# Altium footprint library KwantLib.PcbLib: 249 footprints (part 5 of 16)
Each footprint in its own frame and in the unit in brackets; x right, y up, seen from the top. Pads: shape width x height; smd on the part's side, far side on the other; paste and mask are expansions set on the pad; w line width, h text height; cw(c..) or ccw(c..) is an arc to the next point about the centre after c.
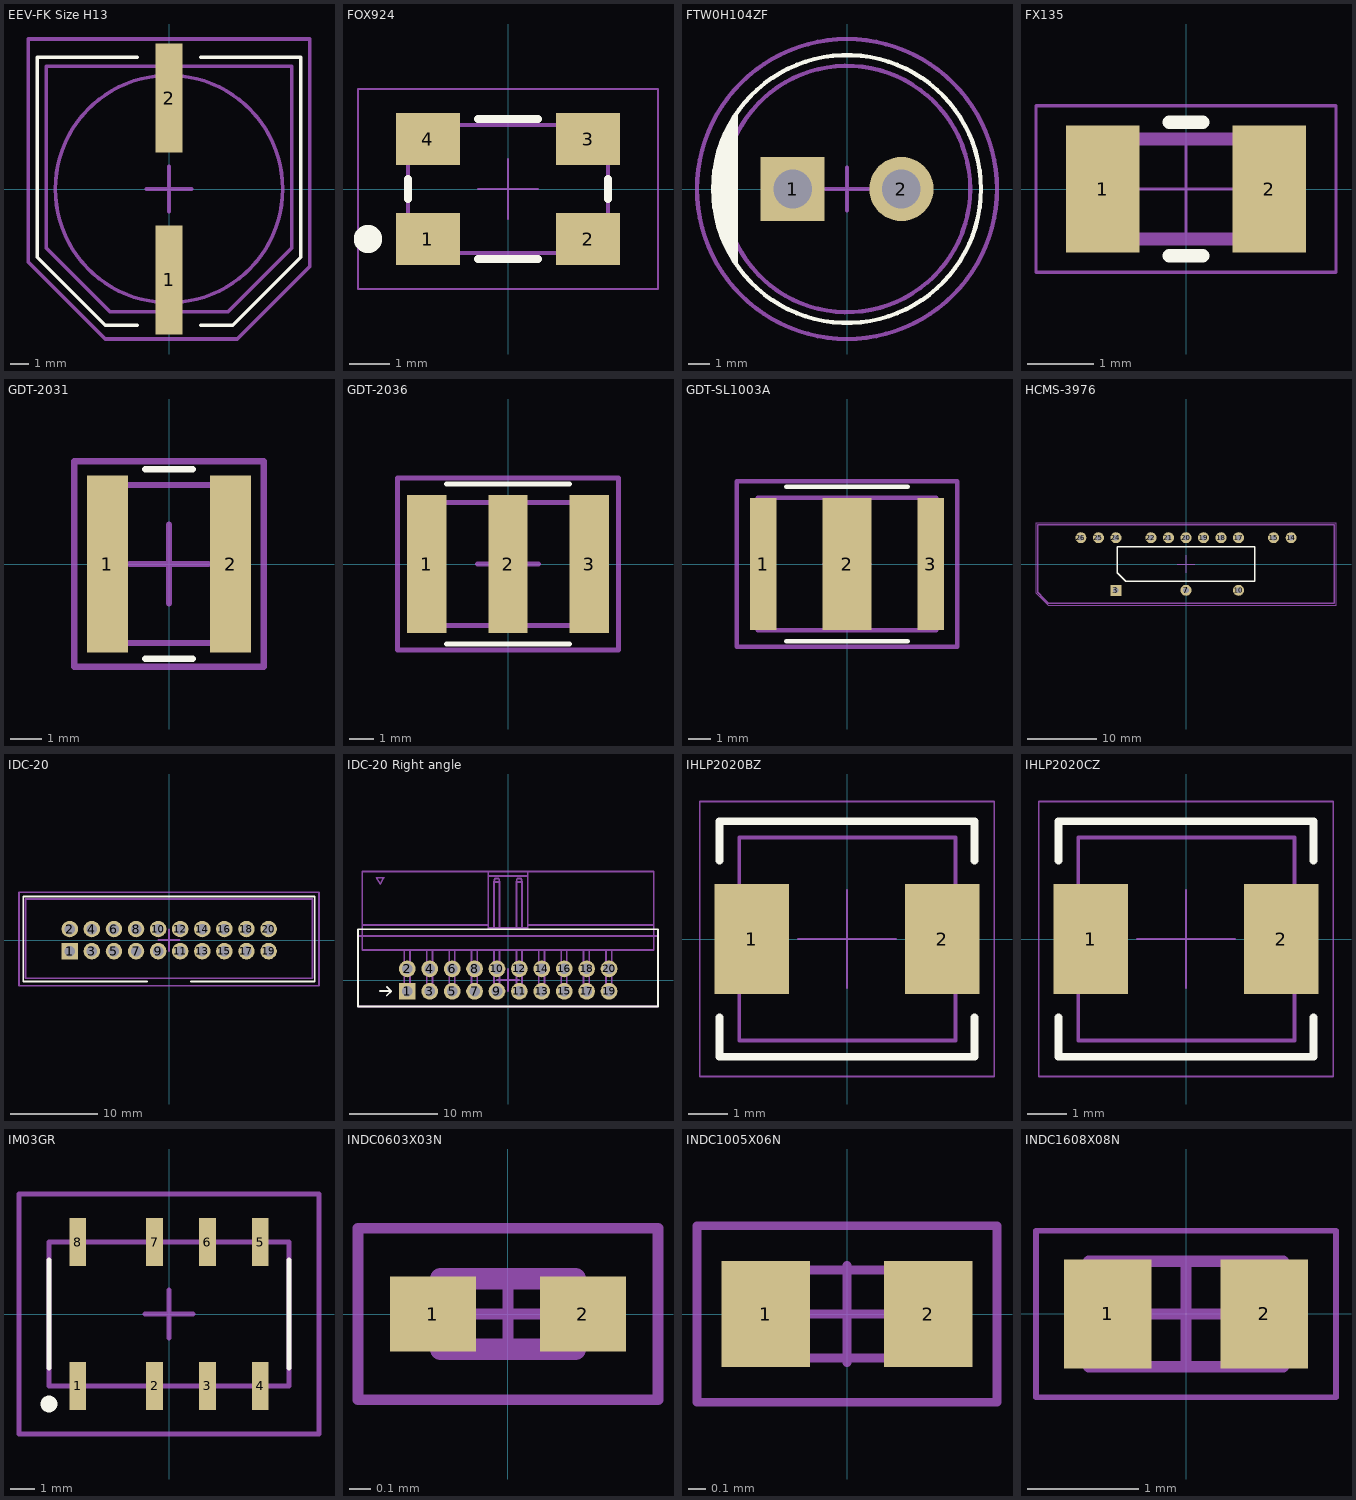
[diagram p4: the footprints below, top view; thin cyan lines are the x and y axes]

## EEV-FK Size H13 [mm] "EEV Aluminum Electrolytic Capacitor"
height 13
pads (2):
  rect 1.5x6 smd mask+0.07: 1(0,-5) 2(0,5)
Top Overlay:
  lines w0.2: -1.75,-7.5 -3.5,-7.5 -7.25,-3.75 -7.25,7.25 -1.75,7.25 ; 1.75,-7.5 3.5,-7.5 7.25,-3.75 7.25,7.25 1.75,7.25
Mechanical 13:
  circle w0.2: c0,0 r6.25
  lines w0.2: -6.75,-3.25 -6.75,6.75 -0.45,6.75 -0.45,7.45 0.45,7.45 0.45,6.75 6.75,6.75 6.75,-3.25 3.25,-6.75 0.45,-6.75 0.45,-7.45 -0.45,-7.45 -0.45,-6.75 -3.25,-6.75 -6.75,-3.25
Mechanical 15:
  lines w0.2: -1.25,0 1.25,0 ; 0,-1.25 0,1.25 ; -7.75,-4 -7.75,8.25 7.75,8.25 7.75,-4.25 3.75,-8.25 -3.5,-8.25 -7.75,-4
3D body: height 8.6, standoff -3.5, extent 0,0 0,0
3D body "EEV-SIZE_H13.stp": height 13.5, standoff 0, extent -6.75,-7.45 6.75,7.45

## FOX924 [mm] "Ultra Miniature SMD TCXO, 5x7mm"
height 1.5
pads (4):
  rect 1.6x1.3 smd paste-0.05: 1(-2,-1.25) 2(2,-1.25) 3(2,1.25) 4(-2,1.25)
Top Overlay:
  circle w0.508: c-3.5,-1.25 r0.1
  lines w0.2: -2.5,-0.25 -2.5,0.25 ; -0.75,-1.75 0.75,-1.75 ; -0.75,1.75 0.75,1.75 ; 2.5,-0.25 2.5,0.25
Mechanical 13:
  lines w0.1: -2.5,-1.6 -2.5,1.6 2.5,1.6 2.5,-1.6 -2.5,-1.6
Mechanical 15:
  lines w0.05: -0.75,0 0.75,0 ; 0,-0.75 0,0.75 ; -3.75,-2.5 3.75,-2.5 3.75,2.5 -3.75,2.5 -3.75,-2.5
3D body "FOX-924.stp": height 1.5, standoff 0, extent -2.5,-1.6 2.5,1.6

## FTW0H104ZF [mm] "Supercapacitor"
height 8.5
pads (2):
  rect 3x3 hole 1.8 mask+0.07: 1(-2.54,0)
  round 3 hole 1.8 mask+0.07: 2(2.54,0)
Top Overlay:
  circle w0.2: c0,0 r6.25
  lines w0.2: -6.15,-0.925 -6.15,0.75 ; -6.05,-1.425 -6.05,1.425 ; -5.925,-1.725 -5.925,1.85 ; -5.825,-2.1 -5.825,2.175 ; -5.7,-2.45 -5.7,2.575 ; -5.55,-2.8 -5.55,2.875 ; -5.4,-3.125 -5.4,3.125 ; -5.275,-3.35 -5.275,3.25 ; -5.175,-3.5 -5.175,3.5
Mechanical 13:
  circle w0.2: c0,0 r5.75
Mechanical 15:
  circle w0.2: c0,0 r7
  lines w0.2: -1,0 1,0 ; 0,-1 0,1
3D body "FTW0H104ZF.stp": height 8.5, standoff -2.7, extent -5.655,-5.748 5.75,5.748

## FX135 [mm] "SMD 3.2x1.5mm Cristal"
height 0.9
pads (2):
  rect 1.1x1.9 smd paste-0.05: 1(-1.25,0) 2(1.25,0)
Top Overlay:
  lines w0.2: -0.25,-1 0.25,-1 ; -0.25,1 0.25,1
Mechanical 13:
  lines w0.2: -1.6,-0.75 -1.6,0.75 1.6,0.75 1.6,-0.75 -1.6,-0.75
Mechanical 15:
  lines w0.05: -0.75,0 0.75,0 ; 0,-0.75 0,0.75 ; -2.25,-1.25 -2.25,1.25 2.25,1.25 2.25,-1.25 -2.25,-1.25
3D body "FX135A.stp": height 0.9, standoff 0, extent -1.6,-0.75 1.6,0.75

## GDT-2031 [mm] "Bourns GDT 2031"
height 5
pads (2):
  rect 1.3x5.6 smd paste-0.06 mask+0.07: 1(-1.95,0) 2(1.95,0)
Top Overlay:
  lines w0.2: -0.75,-3 0.75,-3 ; -0.75,3 0.75,3
Mechanical 13:
  lines w0.2: -2.2,-2.499 2.2,-2.499 2.2,2.499 -2.2,2.499 -2.2,-2.499
Mechanical 15:
  lines w0.2: -1.25,0 1.25,0 ; 0,-1.25 0,1.25 ; -3,-3.25 -3,3.25 3,3.25 3,-3.25 -3,-3.25
3D body "GDT 2031-xxT-SM.stp": height 5, standoff 0, extent -2.2,-2.5 2.2,2.5

## GDT-2036 [mm] "Bourns GDT 2036"
height 5
pads (3):
  rect 1.6x5.6 smd: 1(-3.3,0) 2(0,0) 3(3.3,0)
Top Overlay:
  lines w0.2: -2.5,-3.25 2.5,-3.25 ; -2.5,3.25 2.5,3.25
Mechanical 13:
  lines w0.2: -3.65,-2.499 -3.65,2.501 3.65,2.501 3.65,-2.499 -3.65,-2.499
Mechanical 15:
  lines w0.2: -1.25,0 1.25,0 ; 0,-1.25 0,1.25 ; -4.5,-3.5 -4.5,3.5 4.5,3.5 4.5,-3.5 -4.5,-3.5
3D body: height 5, standoff 0, extent -3.65,-2.499 3.65,2.501

## GDT-SL1003A [mm] "Разрядник LittleFuse"
height 6
pads (3):
  rect 1.2x6 smd: 1(-3.8,0) 3(3.8,0)
  rect 2.2x6 smd: 2(0,0)
Top Overlay:
  lines w0.2: -2.75,-3.5 2.75,-3.5 ; -2.75,3.5 2.75,3.5
Mechanical 13:
  lines w0.2: -4.05,-3 4.05,-3 4.05,3 -4.05,3 -4.05,-3
Mechanical 15:
  lines w0.2: -1,0 1,0 ; 0,-1 0,1 ; -5,-3.75 -5,3.75 5,3.75 5,-3.75 -5,-3.75
3D body "GDT SL1003AxxSM.stp": height 6, standoff 0, extent -4.05,-3 4.05,3

## HCMS-3976 [mm]
height 5.309
pads (14):
  rect 1.6x1.6 hole 0.8: 3(-10.16,-3.81)
  round 1.6 hole 0.8: 7(0,-3.81) 10(7.62,-3.81) 14(15.24,3.81) 15(12.7,3.81) 17(7.62,3.81) 18(5.08,3.81) 19(2.54,3.81) 20(0,3.81) 21(-2.54,3.81) 22(-5.08,3.81) 24(-10.16,3.81) 25(-12.7,3.81) 26(-15.24,3.81)
Top Overlay:
  lines w0.2: -10,-1.25 -8.75,-2.5 10,-2.5 10,2.5 -10,2.5 -10,-1.25
Mechanical 13:
  lines w0.2: -21.46,-4.195 -21.46,4.2 -21.46,4.95 -21.46,5.71 21.46,5.71 21.46,4.95 21.46,4.2 21.46,-4.2 21.46,-4.95 21.46,-5.71 -19.945,-5.71 -20.705,-4.95 -21.455,-4.2 -21.46,-4.195
Mechanical 15:
  lines w0.05: -1.27,0 1.27,0 ; 0,-1.27 0,1.27 ; -21.75,-4.25 -20,-6 21.75,-6 21.75,6 -21.75,6 -21.75,-4.25
3D body "HCMS-3976.stp": height 5.3, standoff -1.5, extent -21.46,-5.71 21.46,5.71

## IDC-20 [mm] "2.54 мм разъем"
height 9.1
pads (20):
  rect 1.9x1.9 hole 1.2: 1(-11.41,-1.27)
  round 1.9 hole 1.2: 2(-11.41,1.27) 3(-8.87,-1.27) 4(-8.87,1.27) 5(-6.33,-1.27) 6(-6.33,1.27) 7(-3.79,-1.27) 8(-3.79,1.27) 9(-1.25,-1.27) 10(-1.25,1.27) 11(1.29,-1.27) 12(1.29,1.27) 13(3.83,-1.27) 14(3.83,1.27) 15(6.37,-1.27) 16(6.37,1.27) 17(8.91,-1.27) 18(8.91,1.27) 19(11.45,-1.27) 20(11.45,1.27)
Top Overlay:
  lines w0.2: -2.5,-4.75 -16.75,-4.75 -16.75,5 16.75,5 16.75,-4.75 2.5,-4.75
Mechanical 13:
  lines w0.2: -16.51,-4.375 -16.51,4.725 16.51,4.725 16.51,-4.375 -16.51,-4.375
Mechanical 15:
  lines w0.2: -1.25,0 1.25,0 ; 0,-1.25 0,1.25 ; -17.25,-5.25 17.25,-5.25 17.25,5.5 -17.25,5.5 -17.25,-5.25
3D body "IDC-20.stp": height 9.1, standoff -2.75, extent -16.51,-4.375 16.51,4.725

## IDC-20 Right angle [mm] "2.54 мм разъем правый"
height 9.1
pads (20):
  rect 1.9x1.9 hole 1.2: 1(-11.41,-1.27)
  round 1.9 hole 1.2: 2(-11.41,1.27) 3(-8.87,-1.27) 4(-8.87,1.27) 5(-6.33,-1.27) 6(-6.33,1.27) 7(-3.79,-1.27) 8(-3.79,1.27) 9(-1.25,-1.27) 10(-1.25,1.27) 11(1.29,-1.27) 12(1.29,1.27) 13(3.83,-1.27) 14(3.83,1.27) 15(6.37,-1.27) 16(6.37,1.27) 17(8.91,-1.27) 18(8.91,1.27) 19(11.45,-1.27) 20(11.45,1.27)
Top Overlay:
  lines w0.2: -14.5,-1.25 -13.25,-1.25 ; -13.75,-1.75 -13.25,-1.25 ; -13.75,-0.75 -13.25,-1.25 ; -17,-3 -17,5.75 17,5.75 17,-3 -17,-3
Mechanical 13:
  lines w0.2: -16.51,6.25 -2.25,6.25 ; -11.75,3.41 -11.75,-0.65 -11.75,-1.59 -11.11,-1.59 -11.11,-0.65 -11.11,3.41 ; -9.21,3.41 -9.21,-0.65 -9.21,-1.59 -8.57,-1.59 -8.57,-0.65 -8.57,3.41 ; -6.67,3.41 -6.67,-0.65 -6.67,-1.59 -6.03,-1.59 -6.03,-0.65 -6.03,3.41 ; -4.13,3.41 -4.13,-0.65 -4.13,-1.59 -3.49,-1.59 -3.49,-0.65 -3.49,3.41 ; -2.25,11.81 2.25,11.81 ; -1.59,3.41 -1.59,-0.65 -1.59,-1.59 -0.95,-1.59 -0.95,-0.65 -0.95,3.41 ; -1.59,5.91 -1.59,11.11 ; -0.95,5.91 -0.95,11.11 ; 0.95,3.41 0.95,-0.65 0.95,-1.59 1.59,-1.59 1.59,-0.65 1.59,3.41 ; 0.95,5.91 0.95,11.11 ; 1.59,5.91 1.59,11.11 ; 2.25,6.25 16.51,6.25 ; 3.49,3.41 3.49,-0.65 3.49,-1.59 4.13,-1.59 4.13,-0.65 4.13,3.41 ; 6.03,3.41 6.03,-0.65 6.03,-1.59 6.67,-1.59 6.67,-0.65 6.67,3.41 ; 8.57,3.41 8.57,-0.65 8.57,-1.59 9.21,-1.59 9.21,-0.65 9.21,3.41 ; 11.11,3.41 11.11,-0.65 11.11,-1.59 11.75,-1.59 11.75,-0.65 11.75,3.41 ; -2.25,12.31 -2.25,5.91 2.25,5.91 2.25,12.31 ; -2.25,12.31 2.25,12.31 ; -2.25,12.31 -16.51,12.31 -16.51,3.41 16.51,3.41 16.51,12.31 2.25,12.31 ; -1.59,11.11 -0.95,11.11 ; -1.59,11.11 -1.49,11.51 -1.05,11.51 -0.95,11.11 ; 0.95,11.11 1.59,11.11 ; 0.95,11.11 1.05,11.51 1.49,11.51 1.59,11.11 ; -14.91,11.61 -14.485,10.874 -14.06,11.61 -14.91,11.61
Mechanical 15:
  lines w0.2: -1.25,0 1.25,0 ; 0,-1.25 0,1.25 ; -17,-3 17,-3 17,5 -17,5 -17,-3
3D body "IDC-20 Right angle v2.stp": height 9, standoff -2.8, extent -16.51,-1.59 16.51,12.31

## IHLP2020BZ [mm]
height 2
pads (2):
  rect 1.905x2.79 smd: 1(-2.425,0) 2(2.425,0)
Top Overlay:
  lines w0.2: -3.25,-2 -3.25,-3 3.25,-3 3.25,-2 ; -3.25,2 -3.25,3 3.25,3 3.25,2
Mechanical 13:
  lines w0.1: -2.745,-2.59 -2.745,2.59 2.758,2.59 2.758,-2.59 -2.745,-2.59
Mechanical 15:
  lines w0.05: -1.25,0 1.25,0 ; 0,-1.25 0,1.25 ; -3.75,-3.5 3.75,-3.5 3.75,3.5 -3.75,3.5 -3.75,-3.5
3D body: height 2, standoff 0.01, extent -2.745,-2.59 2.758,2.59

## IHLP2020CZ [mm]
height 3
pads (2):
  rect 1.905x2.79 smd: 1(-2.425,0) 2(2.425,0)
Top Overlay:
  lines w0.2: -3.25,-2 -3.25,-3 3.25,-3 3.25,-2 ; -3.25,2 -3.25,3 3.25,3 3.25,2
Mechanical 13:
  lines w0.1: -2.745,-2.59 2.758,-2.59 2.758,2.59 -2.745,2.59 -2.745,-2.59
Mechanical 15:
  lines w0.05: -1.25,0 1.25,0 ; 0,-1.25 0,1.25 ; -3.75,-3.5 -3.75,3.5 3.75,3.5 3.75,-3.5 -3.75,-3.5
3D body: height 3, standoff 0.01, extent -2.745,-2.59 2.758,2.59

## IM03GR [mm] "Signal Relay"
height 5.65
pads (8):
  rect 0.7x2 smd: 1(-3.8,-3) 2(-0.6,-3) 3(1.6,-3) 4(3.8,-3) 5(3.8,3) 6(1.6,3) 7(-0.6,3) 8(-3.8,3)
Top Overlay:
  circle w0.4: c-5,-3.75 r0.15
  lines w0.2: -5,-2.25 -5,2.25 ; 5,-2.25 5,2.25
Mechanical 13:
  lines w0.2: -5,-3 -5,3 5,3 5,-3 -5,-3
Mechanical 15:
  lines w0.2: -1,0 1,0 ; 0,-1 0,1 ; -6.25,-5 -6.25,5 6.25,5 6.25,-5 -6.25,-5
3D body: height 5.65, standoff 0.1, extent -5,-3 5,3

## INDC0603X03N [mm] "Chip Inductor, 2-Leads, Body 0.60x0.30mm, IPC Medium Density"
height 0.3
pads (2):
  rect 0.4x0.35 smd paste-1: 1(-0.35,0) 2(0.35,0)
Top Paste:
  region: 0.45,0.15 0.46,0.15 0.478,0.142 0.492,0.128 0.5,0.11 0.5,0.1 0.5,-0.1 0.5,-0.11 0.492,-0.128 0.478,-0.142 0.46,-0.15 0.45,-0.15 0.225,-0.15 0.215,-0.15 0.197,-0.142 0.183,-0.128 0.175,-0.11 0.175,-0.1 0.175,0.1 0.175,0.11 0.183,0.128 0.197,0.142 0.215,0.15 0.225,0.15
  region: -0.45,-0.15 -0.46,-0.15 -0.478,-0.142 -0.492,-0.128 -0.5,-0.11 -0.5,-0.1 -0.5,0.1 -0.5,0.11 -0.492,0.128 -0.478,0.142 -0.46,0.15 -0.45,0.15 -0.225,0.15 -0.215,0.15 -0.197,0.142 -0.183,0.128 -0.175,0.11 -0.175,0.1 -0.175,-0.1 -0.175,-0.11 -0.183,-0.128 -0.197,-0.142 -0.215,-0.15 -0.225,-0.15
Mechanical 13:
  lines w0.1: -0.315,-0.165 -0.315,0.165 0.315,0.165 0.315,-0.165 -0.315,-0.165
Mechanical 15:
  lines w0.05: -0.165,0 0.165,0 ; 0,-0.165 0,0.165 ; -0.7,-0.4 -0.7,0.4 0.7,0.4 0.7,-0.4 -0.7,-0.4
3D body "INDC0603X03N.step": height 0.3, standoff 0, extent -0.315,-0.165 0.315,0.165

## INDC1005X06N [mm] "Chip Inductor, 2-Leads, Body 1.00x0.50mm, IPC Medium Density"
height 0.55
pads (2):
  rect 0.5x0.6 smd paste-0.05 mask+0.07: 1(-0.46,0) 2(0.46,0)
Mechanical 13:
  lines w0.05: -0.5,-0.25 -0.5,0.25 0.5,0.25 0.5,-0.25 -0.5,-0.25
Mechanical 15:
  lines w0.05: -0.275,0 0.275,0 ; 0,-0.275 0,0.275 ; -0.85,-0.5 -0.85,0.5 0.85,0.5 0.85,-0.5 -0.85,-0.5
3D body "INDC1005X05L.step": height 0.5, standoff 0, extent -0.5,-0.25 0.5,0.25

## INDC1608X08N [mm] "Chip Inductor, 2-Leads, Body 1.60x0.80mm, IPC Medium Density"
height 0.8
pads (2):
  rect 0.79x0.98 smd paste-0.04 mask+0.07: 1(-0.705,0) 2(0.705,0)
Mechanical 13:
  lines w0.1: -0.875,-0.475 0.875,-0.475 0.875,0.475 -0.875,0.475 -0.875,-0.475
Mechanical 15:
  lines w0.05: -1.35,-0.75 1.35,-0.75 1.35,0.75 -1.35,0.75 -1.35,-0.75
  lines w0.1: -0.475,0 0.475,0 ; 0,-0.475 0,0.475
3D body "INDC1608X08N.step": height 0.8, standoff 0, extent -0.875,-0.475 0.875,0.475